# Altium footprint library jetson-nano-baseboard.PcbLib: 60 footprints (part 1 of 4)
Each footprint in its own frame and in the unit in brackets; x right, y up, seen from the top. Pads: shape width x height; smd on the part's side, far side on the other; paste and mask are expansions set on the pad; w line width, h text height; cw(c..) or ccw(c..) is an arc to the next point about the centre after c.
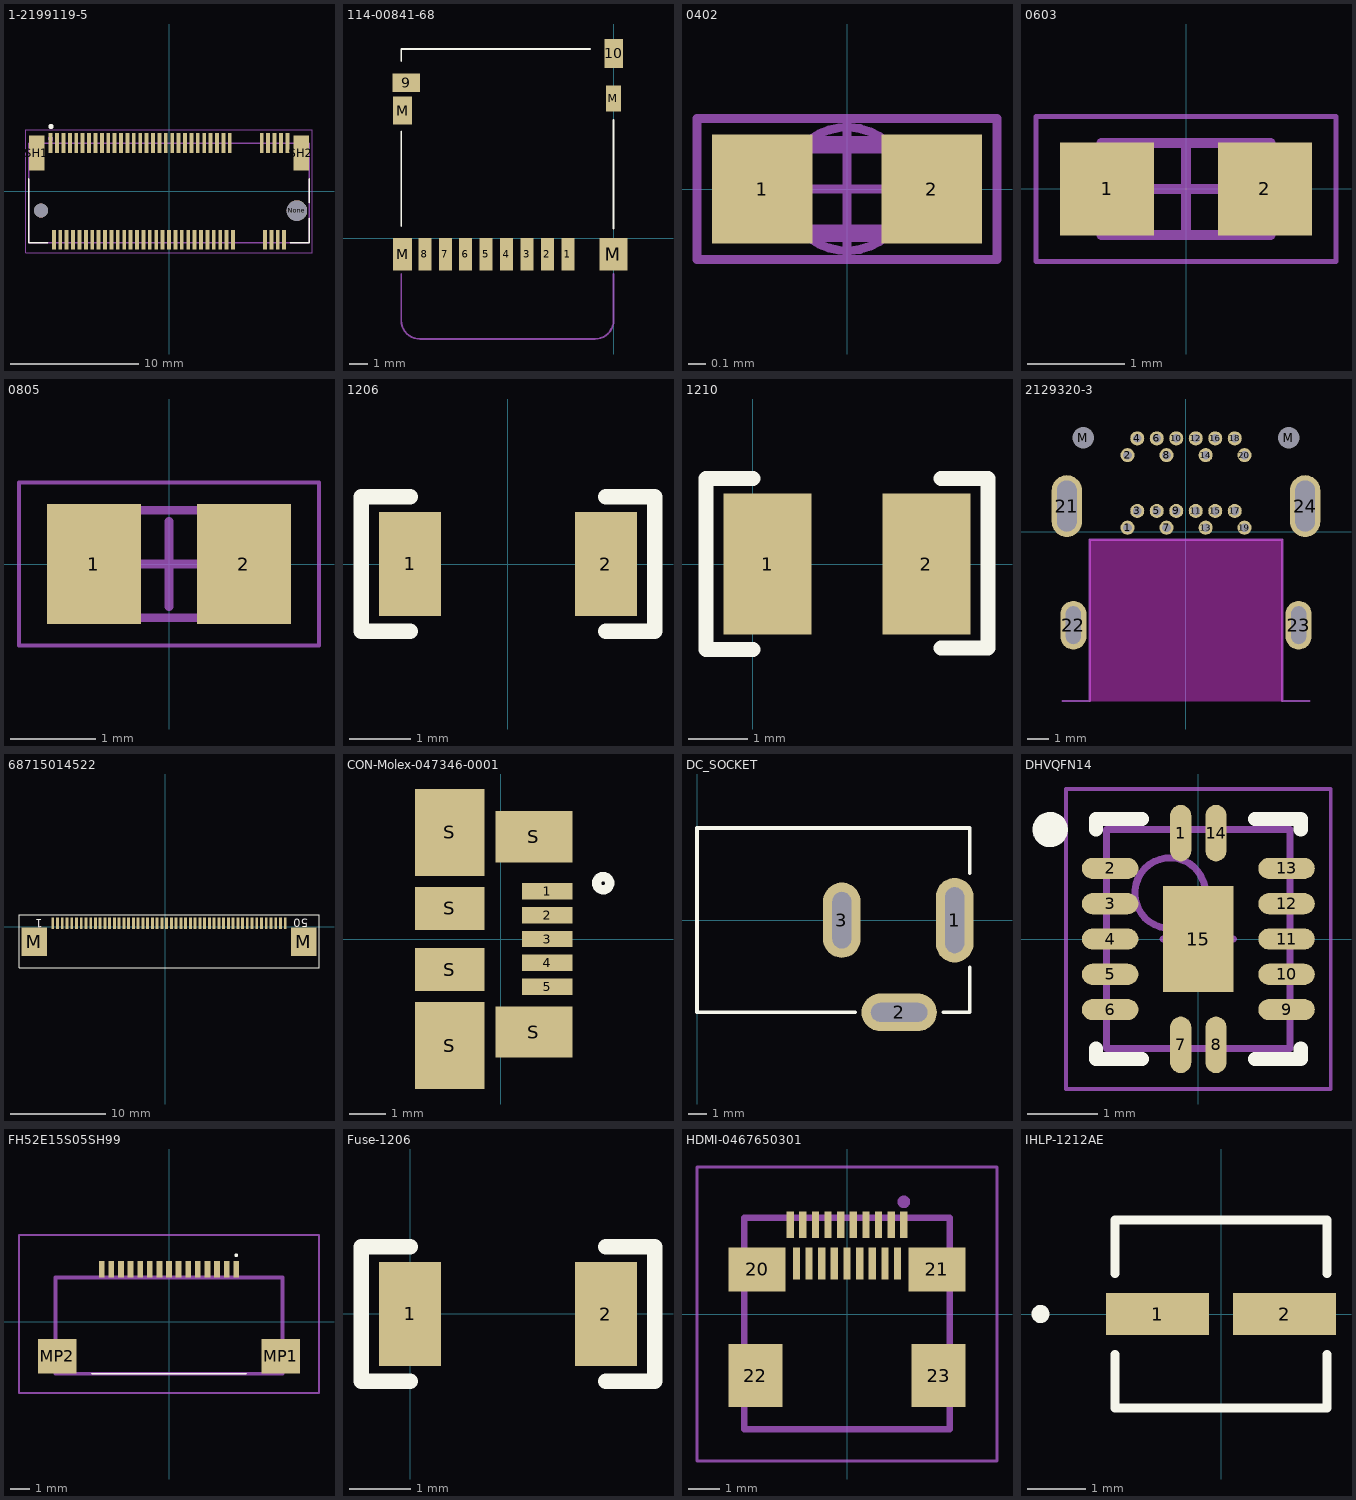
[diagram p0: the footprints below, top view; thin cyan lines are the x and y axes]

## 1-2199119-5 [mm]
pads (71):
  rect 0.3x1.55 smd: 1(-9.25,3.775) 2(-9,-3.775) 3(-8.75,3.775) 4(-8.5,-3.775) 5(-8.25,3.775) 6(-8,-3.775) 7(-7.75,3.775) 8(-7.5,-3.775) 9(-7.25,3.775) 10(-7,-3.775) 11(-6.75,3.775) 12(-6.5,-3.775) 13(-6.25,3.775) 14(-6,-3.775) 15(-5.75,3.775) 16(-5.5,-3.775) 17(-5.25,3.775) 18(-5,-3.775) 19(-4.75,3.775) 20(-4.5,-3.775) 21(-4.25,3.775) 22(-4,-3.775) 23(-3.75,3.775) 24(-3.5,-3.775) 25(-3.25,3.775) 26(-3,-3.775) 27(-2.75,3.775) 28(-2.5,-3.775) 29(-2.25,3.775) 30(-2,-3.775) 31(-1.75,3.775) 32(-1.5,-3.775) 33(-1.25,3.775) 34(-1,-3.775) 35(-0.75,3.775) 36(-0.5,-3.775) 37(-0.25,3.775) 38(0,-3.775) 39(0.25,3.775) 40(0.5,-3.775) 41(0.75,3.775) 42(1,-3.775) 43(1.25,3.775) 44(1.5,-3.775) 45(1.75,3.775) 46(2,-3.775) 47(2.25,3.775) 48(2.5,-3.775) 49(2.75,3.775) 50(3,-3.775) 51(3.25,3.775) 52(3.5,-3.775) 53(3.75,3.775) 54(4,-3.775) 55(4.25,3.775) 56(4.5,-3.775) 57(4.75,3.775) 58(5,-3.775) 67(7.25,3.775) 68(7.5,-3.775) 69(7.75,3.775) 70(8,-3.775) 71(8.25,3.775) 72(8.5,-3.775) 73(8.75,3.775) 74(9,-3.775) 75(9.25,3.775)
  round 1.1 hole 1.1 unplated: None(-10,-1.5)
  round 1.6 hole 1.6 unplated: None(10,-1.5)
  rect 1.2x2.75 smd: SH1(-10.35,3) SH2(10.35,3)
Top Overlay:
  circle w0.2: c-9.225,5.075 r0.1
  lines w0.127: -10.95,1 -10.95,-4 -9.5,-4 ; 9.5,-4 10.95,-4 10.95,-2.1 ; 10.95,-0.9 10.95,1
Mechanical 4:
  circle w0.2: c-9.25,4.115 r0.1
  circle w0.2: c-9.25,4.115 r0.1
  lines w0.127: -10.95,-4 -10.95,3.75 ; -10.95,-4 10.95,-4 ; -10.95,-4 -10.95,3.75 ; -10.95,-4 10.95,-4 ; -10.95,3.75 10.95,3.75 ; -10.95,3.75 10.95,3.75 ; 10.95,-4 10.95,3.75 ; 10.95,-4 10.95,3.75
Mechanical 16:
  lines w0.05: -11.2,-4.8 -11.2,4.8 11.2,4.8 11.2,-4.8 -11.2,-4.8
3D body: height 3.09, standoff -0.54, extent -10.97,-4.36 10.93,4.34

## 114-00841-68 [mm]
pads (14):
  rect 0.7x1.75 smd: 1(-2.455,-0.874) 2(-3.555,-0.874) 3(-4.655,-0.874) 4(-5.755,-0.874) 5(-6.855,-0.874) 6(-7.955,-0.874) 7(-9.055,-0.874) 8(-10.155,-0.874)
  rect 1.5x1 smd: 9(-11.155,8.365)
  rect 1x1.55 smd: 10(0.005,9.94)
  rect 1x1.75 smd: M(-11.355,-0.874)
  rect 1x1.5 smd: M(-11.355,6.865)
  rect 1.5x1.75 smd: M(-0.005,-0.874)
  rect 0.8x1.4 smd: M(-0.005,7.515)
Top Overlay:
  lines w0.1: -11.425,0.65 -11.425,5.73 ; -11.425,9.54 -11.425,10.175 -1.265,10.175 ; 0.005,0.523 0.005,6.365
Mechanical 3:
  lines w0.1: -11.425,-1.925 -11.425,-4.425 ccw(c-10.425,-4.425) -10.425,-5.425 -1,-5.425 ccw(c-1,-4.425) 0,-4.425 0,-1.925
  text "Micro SD Card" at -10.15,-4.075 h0.7
3D body: height 1.6, standoff 0, extent -11.628,-1.382 0.372,10.218

## 0402 [mm]
height 0.35
pads (2):
  rect 0.57x0.62 smd: 1(-0.48,0) 2(0.48,0)
Mechanical 3:
  circle w0.05: c0,0 r0.35
  lines w0.05: -0.5,0 0.5,0 ; 0,-0.4 0,0.4 ; -0.85,-0.4 -0.85,0.4 0.85,0.4 0.85,-0.4 -0.85,-0.4
Mechanical 13:
  lines w0.1: -0.5,-0.25 -0.5,0.25 0.5,0.25 0.5,-0.25 -0.5,-0.25
3D body: height 0.35, standoff 0, extent -0.472,-0.25 0.528,0.25

## 0603 [mm] "Chip Inductor Ferrite Bead 0603"
height 0.6
pads (2):
  rect 0.97x0.96 smd: 1(-0.815,0) 2(0.815,0)
Mechanical 13:
  lines w0.1: -0.875,-0.475 -0.875,0.475 0.875,0.475 0.875,-0.475 -0.875,-0.475
Mechanical 15:
  lines w0.05: -1.55,-0.75 -1.55,0.75 1.55,0.75 1.55,-0.75 -1.55,-0.75
  lines w0.1: -0.475,0 0.475,0 ; 0,-0.475 0,0.475
3D body: height 0.6, standoff 0, extent -0.475,-0.475 0.475,0.475
3D body: height 0.6, standoff 0, extent -0.875,-0.475 -0.475,0.475
3D body: height 0.6, standoff 0, extent 0.475,-0.475 0.875,0.475

## 0805 [mm]
pads (2):
  rect 1.1x1.4 smd: 1(-0.875,0) 2(0.875,0)
Mechanical 13:
  lines w0.1: -1,-0.625 -1,0.625 1,0.625 1,-0.625 -1,-0.625
Mechanical 15:
  lines w0.05: -1.75,-0.95 -1.75,0.95 1.75,0.95 1.75,-0.95 -1.75,-0.95
  lines w0.1: -0.5,0 0.5,0 ; 0,-0.5 0,0.5
3D body: height 0.45, standoff 0, extent -1,-0.625 -1,0.625
3D body: height 0.45, standoff 0, extent 1,-0.625 1,0.625
3D body: height 0.78, standoff 0, extent -1,-0.625 1,0.625

## 1206 [mm]
pads (2):
  rect 1.016x1.7 smd: 1(-1.6,0) 2(1.6,0)
Top Overlay:
  lines w0.254: -1.6,-1.1 -2.4,-1.1 -2.4,1.1 -1.6,1.1 ; 1.6,-1.1 2.4,-1.1 2.4,1.1 1.6,1.1
3D body: height 0.61, standoff -0.01, extent -1.627,-0.787 1.577,0.838

## 1210 [mm]
pads (2):
  rect 1.5x2.4 smd: 1(0.25,0) 2(2.95,0)
Top Overlay:
  lines w0.254: 0,-1.45 -0.8,-1.45 -0.8,1.45 0,1.45 ; 3.2,-1.425 4,-1.425 4,1.45 3.2,1.45
3D body: height 1.3, standoff -1.3, extent -0.125,-0.75 3.275,0.75

## 2129320-3 [mm]
pads (26):
  round 0.65 hole 0.4 unplated: 1(-2.7,0.175) 2(-2.7,3.525) 3(-2.25,0.95) 4(-2.25,4.3) 5(-1.35,0.95) 6(-1.35,4.3) 7(-0.9,0.175) 8(-0.9,3.525) 9(-0.45,0.95) 10(-0.45,4.3) 11(0.45,0.95) 12(0.45,4.3) 13(0.908,0.175) 14(0.908,3.525) 15(1.35,0.95) 16(1.35,4.3) 17(2.25,0.95) 18(2.25,4.3) 19(2.7,0.175) 20(2.7,3.525)
  oval 1.4x2.85 hole 0.9 slot 2.35 at 90 deg: 21(-5.5,1.175) 24(5.5,1.175)
  oval 1.2x2.25 hole 0.7 slot 1.74 at 90 deg: 22(-5.2,-4.325) 23(5.2,-4.325)
  round 0.75 hole 1: M(-4.75,4.325) M(4.75,4.325)
Keep-Out Layer:
  board cut-out: -4.445,-0.381 4.445,-0.381 4.445,-7.825 -4.445,-7.825
Mechanical 1:
  lines w0.1: -5.7,-7.825 -5.2,-7.825 -4.445,-7.825 -4.445,-0.381 4.445,-0.381 4.445,-7.825 5.2,-7.825 5.7,-7.825
  text "PCB edge" at -2.921,-9.144 h0.76
3D body: height 4.18, standoff -2.22, extent -5.7,-7.825 5.7,4.825

## 68715014522 [mm] "50 pins"
height 2.1
pads (52):
  rect 0.3x1.2 smd: 1(-11.865,0.381) 2(-11.365,0.381) 3(-10.865,0.381) 4(-10.365,0.381) 5(-9.865,0.381) 6(-9.365,0.381) 7(-8.865,0.381) 8(-8.365,0.381) 9(-7.865,0.381) 10(-7.365,0.381) 11(-6.865,0.381) 12(-6.365,0.381) 13(-5.865,0.381) 14(-5.365,0.381) 15(-4.865,0.381) 16(-4.365,0.381) 17(-3.865,0.381) 18(-3.365,0.381) 19(-2.865,0.381) 20(-2.365,0.381) 21(-1.865,0.381) 22(-1.365,0.381) 23(-0.865,0.381) 24(-0.365,0.381) 25(0.135,0.381) 26(0.635,0.381) 27(1.135,0.381) 28(1.635,0.381) 29(2.135,0.381) 30(2.635,0.381) 31(3.135,0.381) 32(3.635,0.381) 33(4.135,0.381) 34(4.635,0.381) 35(5.135,0.381) 36(5.635,0.381) 37(6.135,0.381) 38(6.635,0.381) 39(7.135,0.381) 40(7.635,0.381) 41(8.135,0.381) 42(8.635,0.381) 43(9.135,0.381) 44(9.635,0.381) 45(10.135,0.381) 46(10.635,0.381) 47(11.135,0.381) 48(11.635,0.381) 49(12.135,0.381) 50(12.635,0.381)
  rect 2.7x3 smd: M(-13.795,-1.599) M(14.565,-1.599)
Top Overlay:
  lines w0.127: -15.415,-4.319 16.185,-4.319 16.185,1.281 -15.415,1.281 -15.415,-4.319
  text "50" at 15.072,0.826 h0.9
  text "1" at -12.919,0.775 h0.9
3D body: height 2.06, standoff -0.04, extent -15.319,-4.324 16.081,0.776

## CON-Molex-047346-0001 [mm]
pads (11):
  rect 1.38x0.45 smd: 1(1.263,1.3) 2(1.263,0.65) 3(1.263,0) 4(1.263,-0.65) 5(1.263,-1.3)
  rect 1.9x2.37 smd: S(-1.397,-2.91) S(-1.397,2.91)
  rect 1.9x1.175 smd: S(-1.397,-0.837) S(-1.397,0.837)
  rect 2.1x1.4 smd: S(0.903,-2.54) S(0.903,2.794)
Top Overlay:
  circle w0.254: c2.794,1.524 r0.18
3D body: height 2.71, standoff -0.23, extent -3.796,-3.99 1.634,3.99

## DC_SOCKET [mm]
height 11
pads (3):
  oval 2x4.5 hole 1 slot 3.5 at 90 deg: 1(13.7,0)
  oval 4x2 hole 1 slot 3 at 0 deg: 2(10.75,-4.9)
  oval 2x4 hole 1 slot 3 at 90 deg: 3(7.7,0)
Top Overlay:
  lines w0.2: 8.4,-4.9 0,-4.9 0,4.9 14.5,4.9 14.5,2.5 ; 13.1,-4.9 14.5,-4.9 14.5,-2.5
3D body: height 11.01, standoff -3.49, extent 0,-5.1 14.1,4.5

## DHVQFN14 [mm] "QFN, 14-Leads, Body 2.50x3.00mm, Pitch 0.50mm, Thermal Pad 1.00x1.50mm, IPC Medium Density"
height 1
pads (15):
  oval 0.3x0.8 smd: 1(-0.25,1.5) 7(-0.25,-1.5) 8(0.25,-1.5) 14(0.25,1.5)
  oval 0.8x0.3 smd: 2(-1.25,1) 3(-1.25,0.5) 4(-1.25,0) 5(-1.25,-0.5) 6(-1.25,-1) 9(1.25,-1) 10(1.25,-0.5) 11(1.25,0) 12(1.25,0.5) 13(1.25,1)
  rect 1x1.5 smd: 15(0,0)
Top Overlay:
  circle w0.25: c-2.1,1.55 r0.125
  lines w0.2: -1.45,-1.55 -1.45,-1.7 -0.8,-1.7 ; -1.45,1.55 -1.45,1.7 -0.8,1.7 ; 0.8,-1.7 1.45,-1.7 1.45,-1.55 ; 0.8,1.7 1.45,1.7 1.45,1.55
Mechanical 13:
  circle w0.1: c-0.4,0.65 r0.5
  lines w0.1: -1.3,-1.55 -1.3,1.55 1.3,1.55 1.3,-1.55 -1.3,-1.55
Mechanical 15:
  lines w0.05: -1.875,-2.125 -1.875,2.125 1.875,2.125 1.875,-2.125 -1.875,-2.125
  lines w0.1: -0.5,0 0.5,0 ; 0,-0.5 0,0.5
3D body: height 0.85, standoff -0.02, extent -1.252,-1.501 1.25,1.501

## FH52E15S05SH99 [mm]
pads (17):
  rect 0.3x0.85 smd: 1(3.5,2.712) 2(3,2.712) 3(2.5,2.712) 4(2,2.712) 5(1.5,2.712) 6(1,2.712) 7(0.5,2.712) 8(0,2.712) 9(-0.5,2.712) 10(-1,2.712) 11(-1.5,2.712) 12(-2,2.712) 13(-2.5,2.712) 14(-3,2.712) 15(-3.5,2.712)
  rect 2x1.8 smd: MP1(5.8,-1.813) MP2(-5.8,-1.813)
Top Overlay:
  lines w0.1: -4,-2.712 4,-2.712 ; 3.5,3.4 ccw(c3.5,3.45) 3.5,3.5 ccw(c3.5,3.45) 3.5,3.4
Mechanical 13:
  lines w0.2: -5.9,-2.712 5.9,-2.712 5.9,2.288 -5.9,2.288 -5.9,-2.712
Mechanical 15:
  lines w0.1: -7.8,-3.713 7.8,-3.713 7.8,4.5 -7.8,4.5 -7.8,-3.713
3D body: height 2, standoff 0, extent -6.3,-2.775 6.3,2.975

## Fuse-1206 [mm]
pads (2):
  rect 1.016x1.7 smd: 1(0,0) 2(3.2,0)
Top Overlay:
  lines w0.254: 0,-1.1 -0.8,-1.1 -0.8,1.1 0,1.1 ; 3.2,-1.1 4,-1.1 4,1.1 3.2,1.1
3D body: height 1.43, standoff -0.03, extent -0.026,-0.825 3.176,0.827

## HDMI-0467650301 [mm]
pads (23):
  rect 0.23x0.85 smd: 1(1.8,2.825) 3(1.4,2.825) 5(1,2.825) 7(0.6,2.825) 9(0.2,2.825) 11(-0.2,2.825) 13(-0.6,2.825) 15(-1,2.825) 17(-1.4,2.825) 19(-1.8,2.825)
  rect 0.23x1 smd: 2(1.6,1.6) 4(1.2,1.6) 6(0.8,1.6) 8(0.4,1.6) 10(0,1.6) 12(-0.4,1.6) 14(-0.8,1.6) 16(-1.2,1.6) 18(-1.6,1.6)
  rect 1.8x1.38 smd: 20(-2.85,1.41) 21(2.85,1.41)
  rect 1.7x2 smd: 22(-2.9,-1.95) 23(2.9,-1.95)
Mechanical 3:
  lines w0.1: -4.75,-4.65 -4.75,4.65 4.75,4.65 4.75,-4.65 -4.75,-4.65
  lines w0.2: -3.25,-3.65 -3.25,3.05 3.25,3.05 3.25,-3.65 -3.25,-3.65
Mechanical 7:
  lines w0.1: -3.25,-3.45 -3.25,-3.65 3.25,-3.65 3.25,-3.45 ; -3.25,2.55 -3.25,3.05 -2.5,3.05 ; 2.5,3.05 3.25,3.05 3.25,2.55
  lines w0.2: 1.7,3.55 ccw(c1.8,3.55) 1.9,3.55 ccw(c1.8,3.55) 1.7,3.55
3D body: height 2.98, standoff 0.01, extent -3.275,-4.4 3.225,3.1

## IHLP-1212AE [mil]
pads (2):
  rect 69x28 smd: 1(-42.5,0) 2(42.5,0)
Top Overlay:
  circle w6: c-121,0 r3
  lines w6: -71,-27.1 -71,-63 71,-63 71,-27.1 ; -71,27.1 -71,63 71,63 71,27.1
3D body: height 61, standoff 0, extent -71,-63 71,63